# Altium footprint library SI944C.PcbLib: 78 footprints (part 4 of 5)
Each footprint in its own frame and in the unit in brackets; x right, y up, seen from the top. Pads: shape width x height; smd on the part's side, far side on the other; paste and mask are expansions set on the pad; w line width, h text height; cw(c..) or ccw(c..) is an arc to the next point about the centre after c.
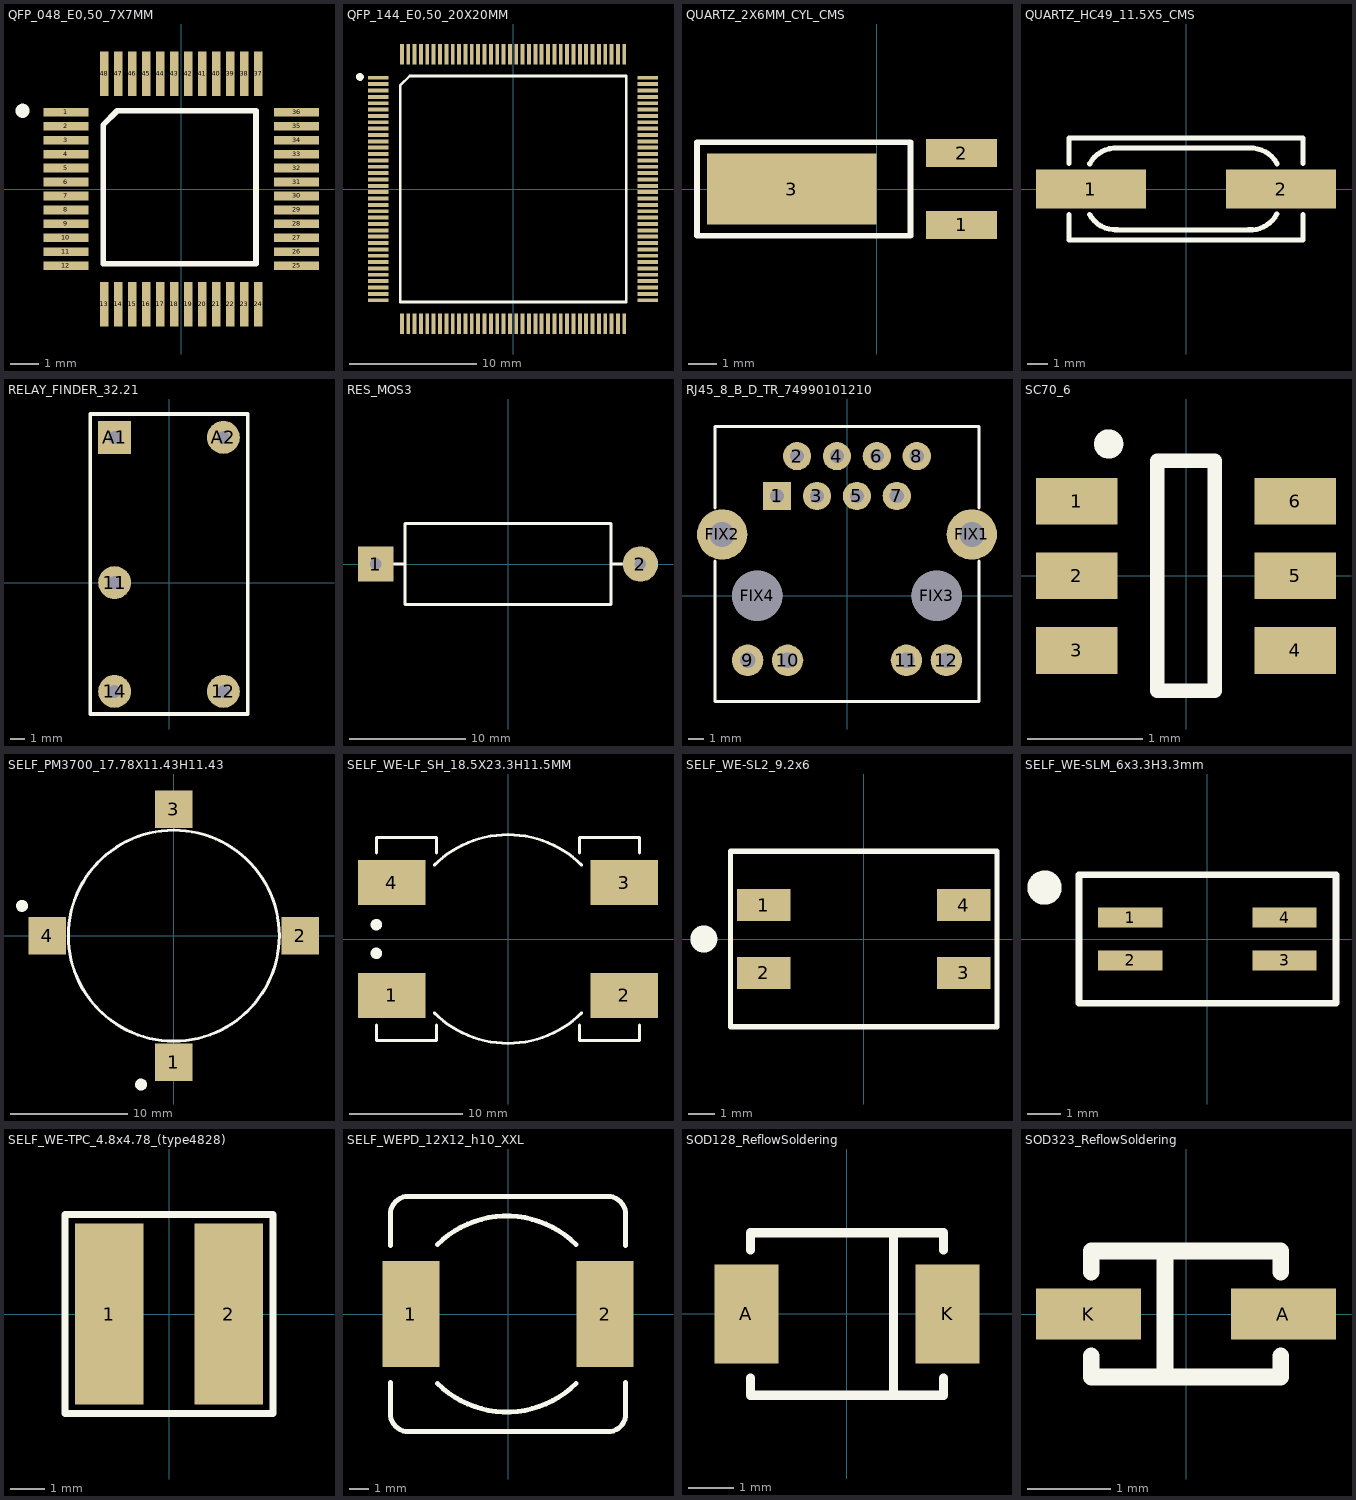
[diagram p3: the footprints below, top view; thin cyan lines are the x and y axes]

## QFP_048_E0,50_7X7MM [mil]
pads (48):
  rect 63x12 smd paste-2 mask+4: 1(-162.25,108.27)
  rect 63x12 smd paste-2 mask+5: 2(-162.25,88.58) 3(-162.25,68.9) 4(-162.25,49.21) 5(-162.25,29.53) 6(-162.25,9.84) 7(-162.25,-9.84) 8(-162.25,-29.53) 9(-162.25,-49.21) 10(-162.25,-68.9) 11(-162.25,-88.58) 12(-162.25,-108.27) 25(162.25,-108.27) 26(162.25,-88.58) 27(162.25,-68.9) 28(162.25,-49.21) 29(162.25,-29.53) 30(162.25,-9.84) 31(162.25,9.84) 32(162.25,29.53) 33(162.25,49.21) 34(162.25,68.9) 35(162.25,88.58) 36(162.25,108.27)
  rect 12x63 smd paste-2 mask+5: 13(-108.27,-162.25) 14(-88.58,-162.25) 15(-68.9,-162.25) 16(-49.21,-162.25) 17(-29.53,-162.25) 18(-9.84,-162.25) 19(9.84,-162.25) 20(29.53,-162.25) 21(49.21,-162.25) 22(68.9,-162.25) 23(88.58,-162.25) 24(108.27,-162.25) 37(108.27,162.25) 38(88.58,162.25) 39(68.9,162.25) 40(49.21,162.25) 41(29.53,162.25) 42(9.84,162.25) 43(-9.84,162.25) 44(-29.53,162.25) 45(-49.21,162.25) 46(-68.9,162.25) 47(-88.58,162.25) 48(-108.27,162.25)
Top Overlay:
  circle w10: c-223.33,110.03 r5
  lines w8: -110,-105 105,-105 105,110 -90,110 -110,90 -110,-105
3D body "User Library-LQFP48-7x7-0_50.step": height 57.69, standoff 0.6, extent -177.16,-177.16 177.17,177.17

## QFP_144_E0,50_20X20MM [mil]
pads (144):
  rect 63x12 smd paste-2 mask+5: 1(-417.32,344.49) 2(-417.32,324.8) 3(-417.32,305.12) 4(-417.32,285.43) 5(-417.32,265.75) 6(-417.32,246.06) 7(-417.32,226.38) 8(-417.32,206.69) 9(-417.32,187.01) 10(-417.32,167.32) 11(-417.32,147.64) 12(-417.32,127.95) 13(-417.32,108.27) 14(-417.32,88.58) 15(-417.32,68.9) 16(-417.32,49.21) 17(-417.32,29.53) 18(-417.32,9.84) 19(-417.32,-9.84) 20(-417.32,-29.53) 21(-417.32,-49.21) 22(-417.32,-68.9) 23(-417.32,-88.58) 24(-417.32,-108.27) 25(-417.32,-127.95) 26(-417.32,-147.64) 27(-417.32,-167.32) 28(-417.32,-187.01) 29(-417.32,-206.69) 30(-417.32,-226.38) 31(-417.32,-246.06) 32(-417.32,-265.75) 33(-417.32,-285.43) 34(-417.32,-305.12) 35(-417.32,-324.8) 36(-417.32,-344.49) 73(417.32,-344.49) 74(417.32,-324.8) 75(417.32,-305.12) 76(417.32,-285.43) 77(417.32,-265.75) 78(417.32,-246.06) 79(417.32,-226.38) 80(417.32,-206.69) 81(417.32,-187.01) 82(417.32,-167.32) 83(417.32,-147.64) 84(417.32,-127.95) 85(417.32,-108.27) 86(417.32,-88.58) 87(417.32,-68.9) 88(417.32,-49.21) 89(417.32,-29.53) 90(417.32,-9.84) 91(417.32,9.84) 92(417.32,29.53) 93(417.32,49.21) 94(417.32,68.9) 95(417.32,88.58) 96(417.32,108.27) 97(417.32,127.95) 98(417.32,147.64) 99(417.32,167.32) 100(417.32,187.01) 101(417.32,206.69) 102(417.32,226.38) 103(417.32,246.06) 104(417.32,265.75) 105(417.32,285.43) 106(417.32,305.12) 107(417.32,324.8) 108(417.32,344.49)
  rect 12x63 smd paste-2 mask+5: 37(-344.49,-417.32) 38(-324.8,-417.32) 39(-305.12,-417.32) 40(-285.43,-417.32) 41(-265.75,-417.32) 42(-246.06,-417.32) 43(-226.38,-417.32) 44(-206.69,-417.32) 45(-187.01,-417.32) 46(-167.32,-417.32) 47(-147.64,-417.32) 48(-127.95,-417.32) 49(-108.27,-417.32) 50(-88.58,-417.32) 51(-68.9,-417.32) 52(-49.21,-417.32) 53(-29.53,-417.32) 54(-9.84,-417.32) 55(9.84,-417.32) 56(29.53,-417.32) 57(49.21,-417.32) 58(68.9,-417.32) 59(88.58,-417.32) 60(108.27,-417.32) 61(127.95,-417.32) 62(147.64,-417.32) 63(167.32,-417.32) 64(187.01,-417.32) 65(206.69,-417.32) 66(226.38,-417.32) 67(246.06,-417.32) 68(265.75,-417.32) 69(285.43,-417.32) 70(305.12,-417.32) 71(324.8,-417.32) 72(344.49,-417.32) 109(344.49,417.32) 110(324.8,417.32) 111(305.12,417.32) 112(285.43,417.32) 113(265.75,417.32) 114(246.06,417.32) 115(226.38,417.32) 116(206.69,417.32) 117(187.01,417.32) 118(167.32,417.32) 119(147.64,417.32) 120(127.95,417.32) 121(108.27,417.32) 122(88.58,417.32) 123(68.9,417.32) 124(49.21,417.32) 125(29.53,417.32) 126(9.84,417.32) 127(-9.84,417.32) 128(-29.53,417.32) 129(-49.21,417.32) 130(-68.9,417.32) 131(-88.58,417.32) 132(-108.27,417.32) 133(-127.95,417.32) 134(-147.64,417.32) 135(-167.32,417.32) 136(-187.01,417.32) 137(-206.69,417.32) 138(-226.38,417.32) 139(-246.06,417.32) 140(-265.75,417.32) 141(-285.43,417.32) 142(-305.12,417.32) 143(-324.8,417.32) 144(-344.49,417.32)
Top Overlay:
  circle w12: c-474.3,347 r6
  lines w8: -350,-350 350,-350 350,350 -320,350 -350,320 -350,-350
3D body "User Library-LQFP144.STEP": height 62.99, standoff 0, extent -433.07,-433.07 433.08,433.07

## QUARTZ_2X6MM_CYL_CMS [mm]
pads (3):
  rect 2.5x1 smd paste-0.051: 1(3,-1.27) 2(3,1.27)
  rect 6x2.5 smd paste-0.051: 3(-3,0)
Top Overlay:
  lines w0.203: -6.35,-1.651 1.191,-1.651 1.191,1.651 -6.35,1.651 -6.35,-1.651
3D body "SW3dPS-TC38 SMD.STEP": height 2.2, standoff -0.05, extent -5.591,-1.397 3.909,1.393

## QUARTZ_HC49_11.5X5_CMS [mil] "HC49/4H SMX"
pads (2):
  rect 216x77 smd paste-3: 1(-187.01,0) 2(187.01,0)
Top Overlay:
  lines w10: -230,-50 -230,-100 230,-100 230,-50 ; -230,50 -230,100 230,100 230,50 ; -189.62,-49.82 ccw(c-138.61,-22.23) -134.96,-80.12 ; -189.31,49.68 cw(c-138.01,22.63) -134.36,80.51 ; -139.3,-80.3 123.2,-80.3 ; -134,80.5 128.5,80.5 ; 123.46,-80.21 ccw(c127.11,-22.33) 178.5,-49.2 ; 124.16,80.32 cw(c127.81,22.43) 179.11,49.48
3D body "SW3dPS-hc49_cystal.STEP": height 200, standoff 0, extent -263.78,-96.45 263.78,96.46

## RELAY_FINDER_32.21 [mm]
pads (5):
  round 2.3 hole 0.9: 11(-3.81,0) 12(3.81,-7.62) 14(-3.81,-7.62) A2(3.81,10.16)
  rect 2.3x2.3 hole 0.9: A1(-3.81,10.16)
Top Overlay:
  lines w0.254: -5.5,-9.2 -5.5,11.8 5.5,11.8 5.5,-9.2 -5.5,-9.2
3D body: height 10.7, standoff 0, extent -5.5,-9.2 5.5,11.8

## RES_MOS3 [mil]
pads (2):
  rect 120x120 hole 39.37: 1(-450,0)
  round 120 hole 39.37: 2(450,0)
Top Overlay:
  lines w10: -500,0 -350,0 ; 350,0 500,0 ; -350,-137.8 350,-137.8 350,137.8 -350,137.8 -350,-137.8
3D body "User Library-RES-3W.STEP": height 255.91, standoff -118.11, extent -475,-127.95 456.49,127.95

## RJ45_8_B_D_TR_74990101210 [mm]
pads (16):
  rect 1.8x1.8 hole 0.9: 1(-4.45,6.35)
  round 1.8 hole 0.9: 2(-3.18,8.89) 3(-1.91,6.35) 4(-0.64,8.89) 5(0.63,6.35) 6(1.9,8.89) 7(3.17,6.35) 8(4.44,8.89)
  round 2 hole 1: 9(-6.325,-4.11) 10(-3.785,-4.11) 11(3.785,-4.11) 12(6.325,-4.11)
  round 3.2 hole 1.6: FIX1(7.95,3.9) FIX2(-7.95,3.9)
  round 3.2 hole 3.2 unplated: FIX3(5.715,0) FIX4(-5.715,0)
Top Overlay:
  lines w0.203: -8.4,2.2 -8.4,-6.73 8.4,-6.73 8.4,2.2 ; -8.4,5.6 -8.4,10.77 8.4,10.77 8.4,5.6
3D body "74990101210.stp": height 17.5, standoff -3.5, extent -8.6,-6.73 8.6,10.77

## SC70_6 [mil]
pads (6):
  rect 28x16 smd paste-3 mask+5: 1(-37.4,25.59) 2(-37.4,0) 3(-37.4,-25.59) 4(37.4,-25.59) 5(37.4,0) 6(37.4,25.59)
Top Overlay:
  circle w5: c-26.5,45.18 r2.5
  lines w5: -9.84,-39.37 9.84,-39.37 9.84,39.37 -9.84,39.37 -9.84,-39.37
3D body "SW3dPS-SC70-6.STEP": height 36.42, standoff -0.98, extent -43.31,-39.37 39.37,39.37

## SELF_PM3700_17.78X11.43H11.43 [mm]
height 11.43
pads (4):
  rect 3.18x3.18 smd paste-0.051: 1(0,-10.795) 2(10.795,0) 4(-10.795,0)
  rect 3.18x3.18 smd paste-0.051 mask+0.102: 3(0,10.795)
Top Overlay:
  circle w0.508: c-12.954,2.54 r0.254
  circle w0.508: c-2.794,-12.7 r0.254
  circle w0.254: c0,0 r9
3D body "User Library-PM3700.STEP": height 11.44, standoff 0, extent -10.795,-10.8 10.805,10.8

## SELF_WE-LF_SH_18.5X23.3H11.5MM [mm]
height 11.5
pads (4):
  rect 6x4 smd paste-0.076: 1(-10.3,-5) 2(10.3,-5) 3(10.3,5) 4(-10.3,5)
Top Overlay:
  circle w0.508: c-11.684,-1.27 r0.254
  circle w0.508: c-11.684,1.27 r0.254
  lines w0.254: -11.65,-7.62 -11.65,-9 -6.35,-9 -6.35,-7.62 ; -11.65,7.62 -11.65,9 -6.35,9 -6.35,7.62 ; -6.541,-6.541 ccw(c0,0) 6.541,-6.541 ; -6.541,6.541 cw(c0,0) 6.541,6.541 ; 6.35,-7.62 6.35,-9 11.65,-9 11.65,-7.62 ; 6.35,7.62 6.35,9 11.65,9 11.65,7.62
3D body "WE-LF_SMD_SH.stp": height 11.07, standoff 0.02, extent -12.275,-9 12.275,9

## SELF_WE-SL2_9.2x6 [mm]
pads (4):
  rect 2x1.2 smd paste-0.076: 1(-3.75,1.27) 2(-3.75,-1.27) 3(3.75,-1.27) 4(3.75,1.27)
Top Overlay:
  circle w0.508: c-6.004,0 r0.254
  lines w0.203: -5,-3.3 5,-3.3 5,3.3 -5,3.3 -5,-3.3
3D body "WE-SL2_74422.stp": height 5, standoff 0, extent -4.6,-3 4.6,3

## SELF_WE-SLM_6x3.3H3.3mm [mm]
pads (4):
  rect 1.9x0.6 smd paste-0.076: 1(-2.286,0.635) 2(-2.286,-0.635) 3(2.286,-0.635) 4(2.286,0.635)
Top Overlay:
  circle w0.508: c-4.826,1.524 r0.254
  lines w0.203: -3.81,-1.905 -3.81,1.905 3.81,1.905 3.81,-1.905 -3.81,-1.905
3D body "WE-SLM_744242.stp": height 3.27, standoff 0.02, extent -3,-1.65 3,1.65

## SELF_WE-TPC_4.8x4.78_(type4828) [mm]
pads (2):
  rect 2x5.3 smd paste-0.102: 1(-1.75,0) 2(1.75,0)
Top Overlay:
  lines w0.203: -3.048,-2.921 3.048,-2.921 3.048,2.921 -3.048,2.921 -3.048,-2.921
3D body "WE-TPC_4828.stp": height 2.79, standoff -0.01, extent -2.4,-2.4 2.4,2.4

## SELF_WEPD_12X12_h10_XXL [mm]
pads (2):
  rect 2.9x5.4 smd paste-0.102: 1(-4.95,0) 2(4.95,0)
Top Overlay:
  lines w0.254: -6,-3.5 -6,-5.08 ccw(c-5.08,-5.08) -5.08,-6 5.1,-6 ccw(c5.1,-5.1) 6,-5.1 6,-3.5 ; -6,3.5 -6,5.08 cw(c-5.08,5.08) -5.08,6 ; -5.1,6 5.08,6 cw(c5.08,5.08) 6,5.08 6,3.5 ; -3.599,-3.536 ccw(c-0.063,0) 3.473,-3.536 ; -3.599,3.536 cw(c-0.063,0) 3.473,3.536
3D body "WE-PD_1210_Metal_TYPE_XXL_12x12xh10.stp": height 10.39, standoff 0.02, extent -6,-6 6,6

## SOD128_ReflowSoldering [mil]
height 43.31
pads (2):
  rect 55.12x85 smd: A(-86.5,0) K(86.5,0)
Top Overlay:
  lines w8: -83,-55 -83,-70 83,-70 83,-55 ; -83,55 -83,70 83,70 83,55 ; 40,-70 40,70
3D body: height 43.7, standoff 43.31, extent 45,-70 76,70
3D body: height 43.31, standoff 0, extent -104.33,-70.87 104.33,70.87

## SOD323_ReflowSoldering [mil]
pads (2):
  rect 50x24 smd paste-3: A(46.26,0) K(-46.26,0)
Top Overlay:
  lines w8: -45,-20 -45,-30 45,-30 45,-20 ; -45,20 -45,30 45,30 45,20 ; -10,-30 -10,30
3D body "SW3dPS-SOD-323.STEP": height 43.5, standoff 0, extent -51.18,-26.57 51.19,26.58